# Altium footprint library Connector_Samtec_HLE_SMD.PcbLib: 290 footprints (part 11 of 24) (continued)
## Samtec_HLE-129-02-xxx-DV_2x29_P2.54mm_Horizontal [mm] (continued)
F.CrtYd:
  lines w0.05: -37.33,-4.17 37.33,-4.17 37.33,4.17 -37.33,4.17 -37.33,-4.17
F.Fab:
  lines w0.1: -36.06,2.54 -35.56,1.833 -35.06,2.54 ; -36.83,-2.54 36.83,-2.54 36.83,2.54 -36.83,2.54 -36.83,-2.54
  text "'.Designator'" at -4.047,-2.68 h1

## Samtec_HLE-130-02-xxx-DV-A_2x30_P2.54mm_Horizontal [mm]
pads (62):
  rect 1.27x2.29 smd: 1(-36.83,2.525) 2(-36.83,-2.525) 3(-34.29,2.525) 4(-34.29,-2.525) 5(-31.75,2.525) 6(-31.75,-2.525) 7(-29.21,2.525) 8(-29.21,-2.525) 9(-26.67,2.525) 10(-26.67,-2.525) 11(-24.13,2.525) 12(-24.13,-2.525) 13(-21.59,2.525) 14(-21.59,-2.525) 15(-19.05,2.525) 16(-19.05,-2.525) 17(-16.51,2.525) 18(-16.51,-2.525) 19(-13.97,2.525) 20(-13.97,-2.525) 21(-11.43,2.525) 22(-11.43,-2.525) 23(-8.89,2.525) 24(-8.89,-2.525) 25(-6.35,2.525) 26(-6.35,-2.525) 27(-3.81,2.525) 28(-3.81,-2.525) 29(-1.27,2.525) 30(-1.27,-2.525) 31(1.27,2.525) 32(1.27,-2.525) 33(3.81,2.525) 34(3.81,-2.525) 35(6.35,2.525) 36(6.35,-2.525) 37(8.89,2.525) 38(8.89,-2.525) 39(11.43,2.525) 40(11.43,-2.525) 41(13.97,2.525) 42(13.97,-2.525) 43(16.51,2.525) 44(16.51,-2.525) 45(19.05,2.525) 46(19.05,-2.525) 47(21.59,2.525) 48(21.59,-2.525) 49(24.13,2.525) 50(24.13,-2.525) 51(26.67,2.525) 52(26.67,-2.525) 53(29.21,2.525) 54(29.21,-2.525) 55(31.75,2.525) 56(31.75,-2.525) 57(34.29,2.525) 58(34.29,-2.525) 59(36.83,2.525) 60(36.83,-2.525)
  round 1.78 hole 1.78: Un1(-35.56,0) Un2(35.56,0)
F.SilkS:
  lines w0.12: -37.725,-2.65 -38.21,-2.65 -38.21,2.65 -37.725,2.65 -37.725,3.67 ; -35.935,-2.65 -35.185,-2.65 ; -35.935,2.65 -35.185,2.65 ; -33.395,-2.65 -32.645,-2.65 ; -33.395,2.65 -32.645,2.65 ; -30.855,-2.65 -30.105,-2.65 ; -30.855,2.65 -30.105,2.65 ; -28.315,-2.65 -27.565,-2.65 ; -28.315,2.65 -27.565,2.65 ; -25.775,-2.65 -25.025,-2.65 ; -25.775,2.65 -25.025,2.65 ; -23.235,-2.65 -22.485,-2.65 ; -23.235,2.65 -22.485,2.65 ; -20.695,-2.65 -19.945,-2.65 ; -20.695,2.65 -19.945,2.65 ; -18.155,-2.65 -17.405,-2.65 ; -18.155,2.65 -17.405,2.65 ; -15.615,-2.65 -14.865,-2.65 ; -15.615,2.65 -14.865,2.65 ; -13.075,-2.65 -12.325,-2.65 ; -13.075,2.65 -12.325,2.65 ; -10.535,-2.65 -9.785,-2.65 ; -10.535,2.65 -9.785,2.65 ; -7.995,-2.65 -7.245,-2.65 ; -7.995,2.65 -7.245,2.65 ; -5.455,-2.65 -4.705,-2.65 ; -5.455,2.65 -4.705,2.65 ; -2.915,-2.65 -2.165,-2.65 ; -2.915,2.65 -2.165,2.65 ; -0.375,-2.65 0.375,-2.65 ; -0.375,2.65 0.375,2.65 ; 2.165,-2.65 2.915,-2.65 ; 2.165,2.65 2.915,2.65 ; 4.705,-2.65 5.455,-2.65 ; 4.705,2.65 5.455,2.65 ; 7.245,-2.65 7.995,-2.65 ; 7.245,2.65 7.995,2.65 ; 9.785,-2.65 10.535,-2.65 ; 9.785,2.65 10.535,2.65 ; 12.325,-2.65 13.075,-2.65 ; 12.325,2.65 13.075,2.65 ; 14.865,-2.65 15.615,-2.65 ; 14.865,2.65 15.615,2.65 ; 17.405,-2.65 18.155,-2.65 ; 17.405,2.65 18.155,2.65 ; 19.945,-2.65 20.695,-2.65 ; 19.945,2.65 20.695,2.65 ; 22.485,-2.65 23.235,-2.65 ; 22.485,2.65 23.235,2.65 ; 25.025,-2.65 25.775,-2.65 ; 25.025,2.65 25.775,2.65 ; 27.565,-2.65 28.315,-2.65 ; 27.565,2.65 28.315,2.65 ; 30.105,-2.65 30.855,-2.65 ; 30.105,2.65 30.855,2.65 ; 32.645,-2.65 33.395,-2.65 ; 32.645,2.65 33.395,2.65 ; 35.185,-2.65 35.935,-2.65 ; 35.185,2.65 35.935,2.65 ; 37.725,-2.65 38.21,-2.65 38.21,2.65 37.725,2.65
F.CrtYd:
  lines w0.05: -38.6,-4.17 38.6,-4.17 38.6,4.17 -38.6,4.17 -38.6,-4.17
F.Fab:
  lines w0.1: -37.33,2.54 -36.83,1.833 -36.33,2.54 ; -38.1,-2.54 38.1,-2.54 38.1,2.54 -38.1,2.54 -38.1,-2.54
  text "'.Designator'" at -4.047,-2.68 h1

## Samtec_HLE-130-02-xxx-DV-BE-A_2x30_P2.54mm_Horizontal [mm]
pads (122):
  rect 1.27x1.68 smd: 1(-36.83,2.72) 2(-36.83,-2.72) 3(-34.29,2.72) 4(-34.29,-2.72) 5(-31.75,2.72) 6(-31.75,-2.72) 7(-29.21,2.72) 8(-29.21,-2.72) 9(-26.67,2.72) 10(-26.67,-2.72) 11(-24.13,2.72) 12(-24.13,-2.72) 13(-21.59,2.72) 14(-21.59,-2.72) 15(-19.05,2.72) 16(-19.05,-2.72) 17(-16.51,2.72) 18(-16.51,-2.72) 19(-13.97,2.72) 20(-13.97,-2.72) 21(-11.43,2.72) 22(-11.43,-2.72) 23(-8.89,2.72) 24(-8.89,-2.72) 25(-6.35,2.72) 26(-6.35,-2.72) 27(-3.81,2.72) 28(-3.81,-2.72) 29(-1.27,2.72) 30(-1.27,-2.72) 31(1.27,2.72) 32(1.27,-2.72) 33(3.81,2.72) 34(3.81,-2.72) 35(6.35,2.72) 36(6.35,-2.72) 37(8.89,2.72) 38(8.89,-2.72) 39(11.43,2.72) 40(11.43,-2.72) 41(13.97,2.72) 42(13.97,-2.72) 43(16.51,2.72) 44(16.51,-2.72) 45(19.05,2.72) 46(19.05,-2.72) 47(21.59,2.72) 48(21.59,-2.72) 49(24.13,2.72) 50(24.13,-2.72) 51(26.67,2.72) 52(26.67,-2.72) 53(29.21,2.72) 54(29.21,-2.72) 55(31.75,2.72) 56(31.75,-2.72) 57(34.29,2.72) 58(34.29,-2.72) 59(36.83,2.72) 60(36.83,-2.72)
  round 0.97 hole 0.97: Un1(-21.59,1.27) Un2(-1.27,-1.27) Un3(-36.83,-1.27) Un4(29.21,1.27) Un5(-24.13,-1.27) Un6(11.43,-1.27) Un7(36.83,-1.27) Un8(-11.43,-1.27) Un9(-16.51,-1.27) Un10(6.35,1.27) Un11(3.81,1.27) Un12(-16.51,1.27) Un13(-34.29,-1.27) Un14(21.59,1.27) Un15(1.27,-1.27) Un16(-8.89,-1.27) Un17(13.97,-1.27) Un18(-6.35,-1.27) Un19(-13.97,1.27) Un20(13.97,1.27) Un21(31.75,-1.27) Un22(26.67,-1.27) Un23(19.05,1.27) Un24(8.89,1.27) Un26(-3.81,1.27) Un27(-11.43,1.27) Un29(-13.97,-1.27) Un30(36.83,1.27) Un31(1.27,1.27) Un32(-31.75,1.27) Un33(-3.81,-1.27) Un34(29.21,-1.27) Un35(16.51,-1.27) Un36(24.13,1.27) Un37(-26.67,-1.27) Un38(3.81,-1.27) Un39(-29.21,-1.27) Un40(31.75,1.27) Un41(-19.05,-1.27) Un42(34.29,1.27) Un43(-26.67,1.27) Un44(-6.35,1.27) Un45(-34.29,1.27) Un46(-1.27,1.27) Un47(-24.13,1.27) Un48(26.67,1.27) Un49(16.51,1.27) Un50(-19.05,1.27) Un51(11.43,1.27) Un52(8.89,-1.27) Un53(-31.75,-1.27) Un54(24.13,-1.27) Un55(-29.21,1.27) Un56(34.29,-1.27) Un57(6.35,-1.27) Un58(-8.89,1.27) Un59(-21.59,-1.27) Un60(21.59,-1.27) Un61(19.05,-1.27) Un62(-36.83,1.27)
  round 1.78 hole 1.78: Un25(35.56,0) Un28(-35.56,0)
F.SilkS:
  lines w0.12: -37.725,-2.65 -38.21,-2.65 -38.21,2.65 -37.725,2.65 -37.725,3.56 ; -35.935,-2.65 -35.185,-2.65 ; -35.935,2.65 -35.185,2.65 ; -33.395,-2.65 -32.645,-2.65 ; -33.395,2.65 -32.645,2.65 ; -30.855,-2.65 -30.105,-2.65 ; -30.855,2.65 -30.105,2.65 ; -28.315,-2.65 -27.565,-2.65 ; -28.315,2.65 -27.565,2.65 ; -25.775,-2.65 -25.025,-2.65 ; -25.775,2.65 -25.025,2.65 ; -23.235,-2.65 -22.485,-2.65 ; -23.235,2.65 -22.485,2.65 ; -20.695,-2.65 -19.945,-2.65 ; -20.695,2.65 -19.945,2.65 ; -18.155,-2.65 -17.405,-2.65 ; -18.155,2.65 -17.405,2.65 ; -15.615,-2.65 -14.865,-2.65 ; -15.615,2.65 -14.865,2.65 ; -13.075,-2.65 -12.325,-2.65 ; -13.075,2.65 -12.325,2.65 ; -10.535,-2.65 -9.785,-2.65 ; -10.535,2.65 -9.785,2.65 ; -7.995,-2.65 -7.245,-2.65 ; -7.995,2.65 -7.245,2.65 ; -5.455,-2.65 -4.705,-2.65 ; -5.455,2.65 -4.705,2.65 ; -2.915,-2.65 -2.165,-2.65 ; -2.915,2.65 -2.165,2.65 ; -0.375,-2.65 0.375,-2.65 ; -0.375,2.65 0.375,2.65 ; 2.165,-2.65 2.915,-2.65 ; 2.165,2.65 2.915,2.65 ; 4.705,-2.65 5.455,-2.65 ; 4.705,2.65 5.455,2.65 ; 7.245,-2.65 7.995,-2.65 ; 7.245,2.65 7.995,2.65 ; 9.785,-2.65 10.535,-2.65 ; 9.785,2.65 10.535,2.65 ; 12.325,-2.65 13.075,-2.65 ; 12.325,2.65 13.075,2.65 ; 14.865,-2.65 15.615,-2.65 ; 14.865,2.65 15.615,2.65 ; 17.405,-2.65 18.155,-2.65 ; 17.405,2.65 18.155,2.65 ; 19.945,-2.65 20.695,-2.65 ; 19.945,2.65 20.695,2.65 ; 22.485,-2.65 23.235,-2.65 ; 22.485,2.65 23.235,2.65 ; 25.025,-2.65 25.775,-2.65 ; 25.025,2.65 25.775,2.65 ; 27.565,-2.65 28.315,-2.65 ; 27.565,2.65 28.315,2.65 ; 30.105,-2.65 30.855,-2.65 ; 30.105,2.65 30.855,2.65 ; 32.645,-2.65 33.395,-2.65 ; 32.645,2.65 33.395,2.65 ; 35.185,-2.65 35.935,-2.65 ; 35.185,2.65 35.935,2.65 ; 37.725,-2.65 38.21,-2.65 38.21,2.65 37.725,2.65
F.CrtYd:
  lines w0.05: -38.6,-4.06 38.6,-4.06 38.6,4.06 -38.6,4.06 -38.6,-4.06
F.Fab:
  lines w0.1: -37.33,2.54 -36.83,1.833 -36.33,2.54 ; -38.1,-2.54 38.1,-2.54 38.1,2.54 -38.1,2.54 -38.1,-2.54
  text "'.Designator'" at -4.047,-2.68 h1

## Samtec_HLE-130-02-xxx-DV-BE-LC_2x30_P2.54mm_Horizontal [mm]
pads (122):
  rect 1.27x1.68 smd: 1(-36.83,2.72) 2(-36.83,-2.72) 3(-34.29,2.72) 4(-34.29,-2.72) 5(-31.75,2.72) 6(-31.75,-2.72) 7(-29.21,2.72) 8(-29.21,-2.72) 9(-26.67,2.72) 10(-26.67,-2.72) 11(-24.13,2.72) 12(-24.13,-2.72) 13(-21.59,2.72) 14(-21.59,-2.72) 15(-19.05,2.72) 16(-19.05,-2.72) 17(-16.51,2.72) 18(-16.51,-2.72) 19(-13.97,2.72) 20(-13.97,-2.72) 21(-11.43,2.72) 22(-11.43,-2.72) 23(-8.89,2.72) 24(-8.89,-2.72) 25(-6.35,2.72) 26(-6.35,-2.72) 27(-3.81,2.72) 28(-3.81,-2.72) 29(-1.27,2.72) 30(-1.27,-2.72) 31(1.27,2.72) 32(1.27,-2.72) 33(3.81,2.72) 34(3.81,-2.72) 35(6.35,2.72) 36(6.35,-2.72) 37(8.89,2.72) 38(8.89,-2.72) 39(11.43,2.72) 40(11.43,-2.72) 41(13.97,2.72) 42(13.97,-2.72) 43(16.51,2.72) 44(16.51,-2.72) 45(19.05,2.72) 46(19.05,-2.72) 47(21.59,2.72) 48(21.59,-2.72) 49(24.13,2.72) 50(24.13,-2.72) 51(26.67,2.72) 52(26.67,-2.72) 53(29.21,2.72) 54(29.21,-2.72) 55(31.75,2.72) 56(31.75,-2.72) 57(34.29,2.72) 58(34.29,-2.72) 59(36.83,2.72) 60(36.83,-2.72)
  round 0.97 hole 0.97: Un1(-6.35,1.27) Un3(16.51,-1.27) Un4(-21.59,1.27) Un5(34.29,-1.27) Un6(6.35,1.27) Un7(-13.97,-1.27) Un8(24.13,-1.27) Un9(6.35,-1.27) Un10(-34.29,-1.27) Un11(36.83,-1.27) Un12(-11.43,1.27) Un13(-26.67,-1.27) Un14(-1.27,-1.27) Un15(21.59,1.27) Un16(24.13,1.27) Un17(11.43,-1.27) Un18(-6.35,-1.27) Un19(29.21,-1.27) Un20(-19.05,1.27) Un21(-34.29,1.27) Un22(26.67,-1.27) Un23(26.67,1.27) Un24(-36.83,-1.27) Un25(31.75,1.27) Un26(-31.75,-1.27) Un27(-11.43,-1.27) Un28(-3.81,1.27) Un29(-1.27,1.27) Un30(-19.05,-1.27) Un31(-16.51,-1.27) Un32(21.59,-1.27) Un34(1.27,-1.27) Un35(-31.75,1.27) Un36(-24.13,1.27) Un37(-16.51,1.27) Un38(3.81,-1.27) Un39(13.97,1.27) Un40(-8.89,-1.27) Un41(11.43,1.27) Un42(16.51,1.27) Un43(-26.67,1.27) Un44(-8.89,1.27) Un45(-36.83,1.27) Un46(8.89,1.27) Un47(3.81,1.27) Un48(31.75,-1.27) Un49(36.83,1.27) Un50(-3.81,-1.27) Un51(19.05,1.27) Un52(-29.21,-1.27) Un53(19.05,-1.27) Un54(29.21,1.27) Un55(-21.59,-1.27) Un56(13.97,-1.27) Un57(-29.21,1.27) Un58(-13.97,1.27) Un59(34.29,1.27) Un60(8.89,-1.27) Un61(1.27,1.27) Un62(-24.13,-1.27)
  round 1.19 hole 1.19: Un2(-35.56,0) Un33(35.56,0)
F.SilkS:
  lines w0.12: -37.725,-2.65 -38.21,-2.65 -38.21,2.65 -37.725,2.65 -37.725,3.56 ; -35.935,-2.65 -35.185,-2.65 ; -35.935,2.65 -35.185,2.65 ; -33.395,-2.65 -32.645,-2.65 ; -33.395,2.65 -32.645,2.65 ; -30.855,-2.65 -30.105,-2.65 ; -30.855,2.65 -30.105,2.65 ; -28.315,-2.65 -27.565,-2.65 ; -28.315,2.65 -27.565,2.65 ; -25.775,-2.65 -25.025,-2.65 ; -25.775,2.65 -25.025,2.65 ; -23.235,-2.65 -22.485,-2.65 ; -23.235,2.65 -22.485,2.65 ; -20.695,-2.65 -19.945,-2.65 ; -20.695,2.65 -19.945,2.65 ; -18.155,-2.65 -17.405,-2.65 ; -18.155,2.65 -17.405,2.65 ; -15.615,-2.65 -14.865,-2.65 ; -15.615,2.65 -14.865,2.65 ; -13.075,-2.65 -12.325,-2.65 ; -13.075,2.65 -12.325,2.65 ; -10.535,-2.65 -9.785,-2.65 ; -10.535,2.65 -9.785,2.65 ; -7.995,-2.65 -7.245,-2.65 ; -7.995,2.65 -7.245,2.65 ; -5.455,-2.65 -4.705,-2.65 ; -5.455,2.65 -4.705,2.65 ; -2.915,-2.65 -2.165,-2.65 ; -2.915,2.65 -2.165,2.65 ; -0.375,-2.65 0.375,-2.65 ; -0.375,2.65 0.375,2.65 ; 2.165,-2.65 2.915,-2.65 ; 2.165,2.65 2.915,2.65 ; 4.705,-2.65 5.455,-2.65 ; 4.705,2.65 5.455,2.65 ; 7.245,-2.65 7.995,-2.65 ; 7.245,2.65 7.995,2.65 ; 9.785,-2.65 10.535,-2.65 ; 9.785,2.65 10.535,2.65 ; 12.325,-2.65 13.075,-2.65 ; 12.325,2.65 13.075,2.65 ; 14.865,-2.65 15.615,-2.65 ; 14.865,2.65 15.615,2.65 ; 17.405,-2.65 18.155,-2.65 ; 17.405,2.65 18.155,2.65 ; 19.945,-2.65 20.695,-2.65 ; 19.945,2.65 20.695,2.65 ; 22.485,-2.65 23.235,-2.65 ; 22.485,2.65 23.235,2.65 ; 25.025,-2.65 25.775,-2.65 ; 25.025,2.65 25.775,2.65 ; 27.565,-2.65 28.315,-2.65 ; 27.565,2.65 28.315,2.65 ; 30.105,-2.65 30.855,-2.65 ; 30.105,2.65 30.855,2.65 ; 32.645,-2.65 33.395,-2.65 ; 32.645,2.65 33.395,2.65 ; 35.185,-2.65 35.935,-2.65 ; 35.185,2.65 35.935,2.65 ; 37.725,-2.65 38.21,-2.65 38.21,2.65 37.725,2.65
F.CrtYd:
  lines w0.05: -38.6,-4.06 38.6,-4.06 38.6,4.06 -38.6,4.06 -38.6,-4.06
F.Fab:
  lines w0.1: -37.33,2.54 -36.83,1.833 -36.33,2.54 ; -38.1,-2.54 38.1,-2.54 38.1,2.54 -38.1,2.54 -38.1,-2.54
  text "'.Designator'" at -4.047,-2.68 h1

## Samtec_HLE-130-02-xxx-DV-BE_2x30_P2.54mm_Horizontal [mm]
pads (120):
  rect 1.27x1.68 smd: 1(-36.83,2.72) 2(-36.83,-2.72) 3(-34.29,2.72) 4(-34.29,-2.72) 5(-31.75,2.72) 6(-31.75,-2.72) 7(-29.21,2.72) 8(-29.21,-2.72) 9(-26.67,2.72) 10(-26.67,-2.72) 11(-24.13,2.72) 12(-24.13,-2.72) 13(-21.59,2.72) 14(-21.59,-2.72) 15(-19.05,2.72) 16(-19.05,-2.72) 17(-16.51,2.72) 18(-16.51,-2.72) 19(-13.97,2.72) 20(-13.97,-2.72) 21(-11.43,2.72) 22(-11.43,-2.72) 23(-8.89,2.72) 24(-8.89,-2.72) 25(-6.35,2.72) 26(-6.35,-2.72) 27(-3.81,2.72) 28(-3.81,-2.72) 29(-1.27,2.72) 30(-1.27,-2.72) 31(1.27,2.72) 32(1.27,-2.72) 33(3.81,2.72) 34(3.81,-2.72) 35(6.35,2.72) 36(6.35,-2.72) 37(8.89,2.72) 38(8.89,-2.72) 39(11.43,2.72) 40(11.43,-2.72) 41(13.97,2.72) 42(13.97,-2.72) 43(16.51,2.72) 44(16.51,-2.72) 45(19.05,2.72) 46(19.05,-2.72) 47(21.59,2.72) 48(21.59,-2.72) 49(24.13,2.72) 50(24.13,-2.72) 51(26.67,2.72) 52(26.67,-2.72) 53(29.21,2.72) 54(29.21,-2.72) 55(31.75,2.72) 56(31.75,-2.72) 57(34.29,2.72) 58(34.29,-2.72) 59(36.83,2.72) 60(36.83,-2.72)
  round 0.97 hole 0.97: Un1(36.83,-1.27) Un2(-6.35,1.27) Un3(19.05,-1.27) Un4(16.51,1.27) Un5(31.75,-1.27) Un6(29.21,-1.27) Un7(6.35,1.27) Un8(-29.21,1.27) Un9(19.05,1.27) Un10(-21.59,1.27) Un11(1.27,1.27) Un12(26.67,1.27) Un13(-34.29,1.27) Un14(-13.97,-1.27) Un15(1.27,-1.27) Un16(6.35,-1.27) Un17(-24.13,1.27) Un18(26.67,-1.27) Un19(-1.27,1.27) Un20(-36.83,-1.27) Un21(-11.43,-1.27) Un22(-36.83,1.27) Un23(34.29,1.27) Un24(13.97,1.27) Un25(-29.21,-1.27) Un26(-19.05,-1.27) Un27(-31.75,1.27) Un28(11.43,-1.27) Un29(31.75,1.27) Un30(-16.51,1.27) Un31(-13.97,1.27) Un32(-26.67,1.27) Un33(-8.89,-1.27) Un34(-3.81,1.27) Un35(13.97,-1.27) Un36(-8.89,1.27) Un37(21.59,1.27) Un38(-34.29,-1.27) Un39(11.43,1.27) Un40(8.89,-1.27) Un41(-26.67,-1.27) Un42(34.29,-1.27) Un43(36.83,1.27) Un44(8.89,1.27) Un45(24.13,-1.27) Un46(-24.13,-1.27) Un47(-16.51,-1.27) Un48(-31.75,-1.27) Un49(3.81,1.27) Un50(-3.81,-1.27) Un51(24.13,1.27) Un52(-6.35,-1.27) Un53(16.51,-1.27) Un54(-1.27,-1.27) Un55(-19.05,1.27) Un56(3.81,-1.27) Un57(29.21,1.27) Un58(-21.59,-1.27) Un59(-11.43,1.27) Un60(21.59,-1.27)
F.SilkS:
  lines w0.12: -37.725,-2.65 -38.21,-2.65 -38.21,2.65 -37.725,2.65 -37.725,3.56 ; -35.935,-2.65 -35.185,-2.65 ; -35.935,2.65 -35.185,2.65 ; -33.395,-2.65 -32.645,-2.65 ; -33.395,2.65 -32.645,2.65 ; -30.855,-2.65 -30.105,-2.65 ; -30.855,2.65 -30.105,2.65 ; -28.315,-2.65 -27.565,-2.65 ; -28.315,2.65 -27.565,2.65 ; -25.775,-2.65 -25.025,-2.65 ; -25.775,2.65 -25.025,2.65 ; -23.235,-2.65 -22.485,-2.65 ; -23.235,2.65 -22.485,2.65 ; -20.695,-2.65 -19.945,-2.65 ; -20.695,2.65 -19.945,2.65 ; -18.155,-2.65 -17.405,-2.65 ; -18.155,2.65 -17.405,2.65 ; -15.615,-2.65 -14.865,-2.65 ; -15.615,2.65 -14.865,2.65 ; -13.075,-2.65 -12.325,-2.65 ; -13.075,2.65 -12.325,2.65 ; -10.535,-2.65 -9.785,-2.65 ; -10.535,2.65 -9.785,2.65 ; -7.995,-2.65 -7.245,-2.65 ; -7.995,2.65 -7.245,2.65 ; -5.455,-2.65 -4.705,-2.65 ; -5.455,2.65 -4.705,2.65 ; -2.915,-2.65 -2.165,-2.65 ; -2.915,2.65 -2.165,2.65 ; -0.375,-2.65 0.375,-2.65 ; -0.375,2.65 0.375,2.65 ; 2.165,-2.65 2.915,-2.65 ; 2.165,2.65 2.915,2.65 ; 4.705,-2.65 5.455,-2.65 ; 4.705,2.65 5.455,2.65 ; 7.245,-2.65 7.995,-2.65 ; 7.245,2.65 7.995,2.65 ; 9.785,-2.65 10.535,-2.65 ; 9.785,2.65 10.535,2.65 ; 12.325,-2.65 13.075,-2.65 ; 12.325,2.65 13.075,2.65 ; 14.865,-2.65 15.615,-2.65 ; 14.865,2.65 15.615,2.65 ; 17.405,-2.65 18.155,-2.65 ; 17.405,2.65 18.155,2.65 ; 19.945,-2.65 20.695,-2.65 ; 19.945,2.65 20.695,2.65 ; 22.485,-2.65 23.235,-2.65 ; 22.485,2.65 23.235,2.65 ; 25.025,-2.65 25.775,-2.65 ; 25.025,2.65 25.775,2.65 ; 27.565,-2.65 28.315,-2.65 ; 27.565,2.65 28.315,2.65 ; 30.105,-2.65 30.855,-2.65 ; 30.105,2.65 30.855,2.65 ; 32.645,-2.65 33.395,-2.65 ; 32.645,2.65 33.395,2.65 ; 35.185,-2.65 35.935,-2.65 ; 35.185,2.65 35.935,2.65 ; 37.725,-2.65 38.21,-2.65 38.21,2.65 37.725,2.65
F.CrtYd:
  lines w0.05: -38.6,-4.06 38.6,-4.06 38.6,4.06 -38.6,4.06 -38.6,-4.06
F.Fab:
  lines w0.1: -37.33,2.54 -36.83,1.833 -36.33,2.54 ; -38.1,-2.54 -38.1,2.54 38.1,2.54 38.1,-2.54 -38.1,-2.54
  text "'.Designator'" at -4.047,-2.68 h1

## Samtec_HLE-130-02-xxx-DV-LC_2x30_P2.54mm_Horizontal [mm]
pads (62):
  rect 1.27x2.29 smd: 1(-36.83,2.525) 2(-36.83,-2.525) 3(-34.29,2.525) 4(-34.29,-2.525) 5(-31.75,2.525) 6(-31.75,-2.525) 7(-29.21,2.525) 8(-29.21,-2.525) 9(-26.67,2.525) 10(-26.67,-2.525) 11(-24.13,2.525) 12(-24.13,-2.525) 13(-21.59,2.525) 14(-21.59,-2.525) 15(-19.05,2.525) 16(-19.05,-2.525) 17(-16.51,2.525) 18(-16.51,-2.525) 19(-13.97,2.525) 20(-13.97,-2.525) 21(-11.43,2.525) 22(-11.43,-2.525) 23(-8.89,2.525) 24(-8.89,-2.525) 25(-6.35,2.525) 26(-6.35,-2.525) 27(-3.81,2.525) 28(-3.81,-2.525) 29(-1.27,2.525) 30(-1.27,-2.525) 31(1.27,2.525) 32(1.27,-2.525) 33(3.81,2.525) 34(3.81,-2.525) 35(6.35,2.525) 36(6.35,-2.525) 37(8.89,2.525) 38(8.89,-2.525) 39(11.43,2.525) 40(11.43,-2.525) 41(13.97,2.525) 42(13.97,-2.525) 43(16.51,2.525) 44(16.51,-2.525) 45(19.05,2.525) 46(19.05,-2.525) 47(21.59,2.525) 48(21.59,-2.525) 49(24.13,2.525) 50(24.13,-2.525) 51(26.67,2.525) 52(26.67,-2.525) 53(29.21,2.525) 54(29.21,-2.525) 55(31.75,2.525) 56(31.75,-2.525) 57(34.29,2.525) 58(34.29,-2.525) 59(36.83,2.525) 60(36.83,-2.525)
  round 1.19 hole 1.19: Un1(-35.56,0) Un2(35.56,0)
F.SilkS:
  lines w0.12: -37.725,-2.65 -38.21,-2.65 -38.21,2.65 -37.725,2.65 -37.725,3.67 ; -35.935,-2.65 -35.185,-2.65 ; -35.935,2.65 -35.185,2.65 ; -33.395,-2.65 -32.645,-2.65 ; -33.395,2.65 -32.645,2.65 ; -30.855,-2.65 -30.105,-2.65 ; -30.855,2.65 -30.105,2.65 ; -28.315,-2.65 -27.565,-2.65 ; -28.315,2.65 -27.565,2.65 ; -25.775,-2.65 -25.025,-2.65 ; -25.775,2.65 -25.025,2.65 ; -23.235,-2.65 -22.485,-2.65 ; -23.235,2.65 -22.485,2.65 ; -20.695,-2.65 -19.945,-2.65 ; -20.695,2.65 -19.945,2.65 ; -18.155,-2.65 -17.405,-2.65 ; -18.155,2.65 -17.405,2.65 ; -15.615,-2.65 -14.865,-2.65 ; -15.615,2.65 -14.865,2.65 ; -13.075,-2.65 -12.325,-2.65 ; -13.075,2.65 -12.325,2.65 ; -10.535,-2.65 -9.785,-2.65 ; -10.535,2.65 -9.785,2.65 ; -7.995,-2.65 -7.245,-2.65 ; -7.995,2.65 -7.245,2.65 ; -5.455,-2.65 -4.705,-2.65 ; -5.455,2.65 -4.705,2.65 ; -2.915,-2.65 -2.165,-2.65 ; -2.915,2.65 -2.165,2.65 ; -0.375,-2.65 0.375,-2.65 ; -0.375,2.65 0.375,2.65 ; 2.165,-2.65 2.915,-2.65 ; 2.165,2.65 2.915,2.65 ; 4.705,-2.65 5.455,-2.65 ; 4.705,2.65 5.455,2.65 ; 7.245,-2.65 7.995,-2.65 ; 7.245,2.65 7.995,2.65 ; 9.785,-2.65 10.535,-2.65 ; 9.785,2.65 10.535,2.65 ; 12.325,-2.65 13.075,-2.65 ; 12.325,2.65 13.075,2.65 ; 14.865,-2.65 15.615,-2.65 ; 14.865,2.65 15.615,2.65 ; 17.405,-2.65 18.155,-2.65 ; 17.405,2.65 18.155,2.65 ; 19.945,-2.65 20.695,-2.65 ; 19.945,2.65 20.695,2.65 ; 22.485,-2.65 23.235,-2.65 ; 22.485,2.65 23.235,2.65 ; 25.025,-2.65 25.775,-2.65 ; 25.025,2.65 25.775,2.65 ; 27.565,-2.65 28.315,-2.65 ; 27.565,2.65 28.315,2.65 ; 30.105,-2.65 30.855,-2.65 ; 30.105,2.65 30.855,2.65 ; 32.645,-2.65 33.395,-2.65 ; 32.645,2.65 33.395,2.65 ; 35.185,-2.65 35.935,-2.65 ; 35.185,2.65 35.935,2.65 ; 37.725,-2.65 38.21,-2.65 38.21,2.65 37.725,2.65
F.CrtYd:
  lines w0.05: -38.6,-4.17 38.6,-4.17 38.6,4.17 -38.6,4.17 -38.6,-4.17
F.Fab:
  lines w0.1: -37.33,2.54 -36.83,1.833 -36.33,2.54 ; -38.1,-2.54 -38.1,2.54 38.1,2.54 38.1,-2.54 -38.1,-2.54
  text "'.Designator'" at -4.047,-2.68 h1

## Samtec_HLE-130-02-xxx-DV_2x30_P2.54mm_Horizontal [mm]
pads (60):
  rect 1.27x2.29 smd: 1(-36.83,2.525) 2(-36.83,-2.525) 3(-34.29,2.525) 4(-34.29,-2.525) 5(-31.75,2.525) 6(-31.75,-2.525) 7(-29.21,2.525) 8(-29.21,-2.525) 9(-26.67,2.525) 10(-26.67,-2.525) 11(-24.13,2.525) 12(-24.13,-2.525) 13(-21.59,2.525) 14(-21.59,-2.525) 15(-19.05,2.525) 16(-19.05,-2.525) 17(-16.51,2.525) 18(-16.51,-2.525) 19(-13.97,2.525) 20(-13.97,-2.525) 21(-11.43,2.525) 22(-11.43,-2.525) 23(-8.89,2.525) 24(-8.89,-2.525) 25(-6.35,2.525) 26(-6.35,-2.525) 27(-3.81,2.525) 28(-3.81,-2.525) 29(-1.27,2.525) 30(-1.27,-2.525) 31(1.27,2.525) 32(1.27,-2.525) 33(3.81,2.525) 34(3.81,-2.525) 35(6.35,2.525) 36(6.35,-2.525) 37(8.89,2.525) 38(8.89,-2.525) 39(11.43,2.525) 40(11.43,-2.525) 41(13.97,2.525) 42(13.97,-2.525) 43(16.51,2.525) 44(16.51,-2.525) 45(19.05,2.525) 46(19.05,-2.525) 47(21.59,2.525) 48(21.59,-2.525) 49(24.13,2.525) 50(24.13,-2.525) 51(26.67,2.525) 52(26.67,-2.525) 53(29.21,2.525) 54(29.21,-2.525) 55(31.75,2.525) 56(31.75,-2.525) 57(34.29,2.525) 58(34.29,-2.525) 59(36.83,2.525) 60(36.83,-2.525)
F.SilkS:
  lines w0.12: -37.725,-2.65 -38.21,-2.65 -38.21,2.65 -37.725,2.65 -37.725,3.67 ; -35.935,-2.65 -35.185,-2.65 ; -35.935,2.65 -35.185,2.65 ; -33.395,-2.65 -32.645,-2.65 ; -33.395,2.65 -32.645,2.65 ; -30.855,-2.65 -30.105,-2.65 ; -30.855,2.65 -30.105,2.65 ; -28.315,-2.65 -27.565,-2.65 ; -28.315,2.65 -27.565,2.65 ; -25.775,-2.65 -25.025,-2.65 ; -25.775,2.65 -25.025,2.65 ; -23.235,-2.65 -22.485,-2.65 ; -23.235,2.65 -22.485,2.65 ; -20.695,-2.65 -19.945,-2.65 ; -20.695,2.65 -19.945,2.65 ; -18.155,-2.65 -17.405,-2.65 ; -18.155,2.65 -17.405,2.65 ; -15.615,-2.65 -14.865,-2.65 ; -15.615,2.65 -14.865,2.65 ; -13.075,-2.65 -12.325,-2.65 ; -13.075,2.65 -12.325,2.65 ; -10.535,-2.65 -9.785,-2.65 ; -10.535,2.65 -9.785,2.65 ; -7.995,-2.65 -7.245,-2.65 ; -7.995,2.65 -7.245,2.65 ; -5.455,-2.65 -4.705,-2.65 ; -5.455,2.65 -4.705,2.65 ; -2.915,-2.65 -2.165,-2.65 ; -2.915,2.65 -2.165,2.65 ; -0.375,-2.65 0.375,-2.65 ; -0.375,2.65 0.375,2.65 ; 2.165,-2.65 2.915,-2.65 ; 2.165,2.65 2.915,2.65 ; 4.705,-2.65 5.455,-2.65 ; 4.705,2.65 5.455,2.65 ; 7.245,-2.65 7.995,-2.65 ; 7.245,2.65 7.995,2.65 ; 9.785,-2.65 10.535,-2.65 ; 9.785,2.65 10.535,2.65 ; 12.325,-2.65 13.075,-2.65 ; 12.325,2.65 13.075,2.65 ; 14.865,-2.65 15.615,-2.65 ; 14.865,2.65 15.615,2.65 ; 17.405,-2.65 18.155,-2.65 ; 17.405,2.65 18.155,2.65 ; 19.945,-2.65 20.695,-2.65 ; 19.945,2.65 20.695,2.65 ; 22.485,-2.65 23.235,-2.65 ; 22.485,2.65 23.235,2.65 ; 25.025,-2.65 25.775,-2.65 ; 25.025,2.65 25.775,2.65 ; 27.565,-2.65 28.315,-2.65 ; 27.565,2.65 28.315,2.65 ; 30.105,-2.65 30.855,-2.65 ; 30.105,2.65 30.855,2.65 ; 32.645,-2.65 33.395,-2.65 ; 32.645,2.65 33.395,2.65 ; 35.185,-2.65 35.935,-2.65 ; 35.185,2.65 35.935,2.65 ; 37.725,-2.65 38.21,-2.65 38.21,2.65 37.725,2.65
F.CrtYd:
  lines w0.05: -38.6,-4.17 -38.6,4.17 38.6,4.17 38.6,-4.17 -38.6,-4.17
F.Fab:
  lines w0.1: -37.33,2.54 -36.83,1.833 -36.33,2.54 ; -38.1,-2.54 -38.1,2.54 38.1,2.54 38.1,-2.54 -38.1,-2.54
  text "'.Designator'" at -4.047,-2.68 h1

## Samtec_HLE-131-02-xxx-DV-A_2x31_P2.54mm_Horizontal [mm]
pads (64):
  rect 1.27x2.29 smd: 1(-38.1,2.525) 2(-38.1,-2.525) 3(-35.56,2.525) 4(-35.56,-2.525) 5(-33.02,2.525) 6(-33.02,-2.525) 7(-30.48,2.525) 8(-30.48,-2.525) 9(-27.94,2.525) 10(-27.94,-2.525) 11(-25.4,2.525) 12(-25.4,-2.525) 13(-22.86,2.525) 14(-22.86,-2.525) 15(-20.32,2.525) 16(-20.32,-2.525) 17(-17.78,2.525) 18(-17.78,-2.525) 19(-15.24,2.525) 20(-15.24,-2.525) 21(-12.7,2.525) 22(-12.7,-2.525) 23(-10.16,2.525) 24(-10.16,-2.525) 25(-7.62,2.525) 26(-7.62,-2.525) 27(-5.08,2.525) 28(-5.08,-2.525) 29(-2.54,2.525) 30(-2.54,-2.525) 31(0,2.525) 32(0,-2.525) 33(2.54,2.525) 34(2.54,-2.525) 35(5.08,2.525) 36(5.08,-2.525) 37(7.62,2.525) 38(7.62,-2.525) 39(10.16,2.525) 40(10.16,-2.525) 41(12.7,2.525) 42(12.7,-2.525) 43(15.24,2.525) 44(15.24,-2.525) 45(17.78,2.525) 46(17.78,-2.525) 47(20.32,2.525) 48(20.32,-2.525) 49(22.86,2.525) 50(22.86,-2.525) 51(25.4,2.525) 52(25.4,-2.525) 53(27.94,2.525) 54(27.94,-2.525) 55(30.48,2.525) 56(30.48,-2.525) 57(33.02,2.525) 58(33.02,-2.525) 59(35.56,2.525) 60(35.56,-2.525) 61(38.1,2.525) 62(38.1,-2.525)
  round 1.78 hole 1.78: Un1(36.83,0) Un2(-36.83,0)
F.SilkS:
  lines w0.12: -38.995,-2.65 -39.48,-2.65 -39.48,2.65 -38.995,2.65 -38.995,3.67 ; -37.205,-2.65 -36.455,-2.65 ; -37.205,2.65 -36.455,2.65 ; -34.665,-2.65 -33.915,-2.65 ; -34.665,2.65 -33.915,2.65 ; -32.125,-2.65 -31.375,-2.65 ; -32.125,2.65 -31.375,2.65 ; -29.585,-2.65 -28.835,-2.65 ; -29.585,2.65 -28.835,2.65 ; -27.045,-2.65 -26.295,-2.65 ; -27.045,2.65 -26.295,2.65 ; -24.505,-2.65 -23.755,-2.65 ; -24.505,2.65 -23.755,2.65 ; -21.965,-2.65 -21.215,-2.65 ; -21.965,2.65 -21.215,2.65 ; -19.425,-2.65 -18.675,-2.65 ; -19.425,2.65 -18.675,2.65 ; -16.885,-2.65 -16.135,-2.65 ; -16.885,2.65 -16.135,2.65 ; -14.345,-2.65 -13.595,-2.65 ; -14.345,2.65 -13.595,2.65 ; -11.805,-2.65 -11.055,-2.65 ; -11.805,2.65 -11.055,2.65 ; -9.265,-2.65 -8.515,-2.65 ; -9.265,2.65 -8.515,2.65 ; -6.725,-2.65 -5.975,-2.65 ; -6.725,2.65 -5.975,2.65 ; -4.185,-2.65 -3.435,-2.65 ; -4.185,2.65 -3.435,2.65 ; -1.645,-2.65 -0.895,-2.65 ; -1.645,2.65 -0.895,2.65 ; 0.895,-2.65 1.645,-2.65 ; 0.895,2.65 1.645,2.65 ; 3.435,-2.65 4.185,-2.65 ; 3.435,2.65 4.185,2.65 ; 5.975,-2.65 6.725,-2.65 ; 5.975,2.65 6.725,2.65 ; 8.515,-2.65 9.265,-2.65 ; 8.515,2.65 9.265,2.65 ; 11.055,-2.65 11.805,-2.65 ; 11.055,2.65 11.805,2.65 ; 13.595,-2.65 14.345,-2.65 ; 13.595,2.65 14.345,2.65 ; 16.135,-2.65 16.885,-2.65 ; 16.135,2.65 16.885,2.65 ; 18.675,-2.65 19.425,-2.65 ; 18.675,2.65 19.425,2.65 ; 21.215,-2.65 21.965,-2.65 ; 21.215,2.65 21.965,2.65 ; 23.755,-2.65 24.505,-2.65 ; 23.755,2.65 24.505,2.65 ; 26.295,-2.65 27.045,-2.65 ; 26.295,2.65 27.045,2.65 ; 28.835,-2.65 29.585,-2.65 ; 28.835,2.65 29.585,2.65 ; 31.375,-2.65 32.125,-2.65 ; 31.375,2.65 32.125,2.65 ; 33.915,-2.65 34.665,-2.65 ; 33.915,2.65 34.665,2.65 ; 36.455,-2.65 37.205,-2.65 ; 36.455,2.65 37.205,2.65 ; 38.995,-2.65 39.48,-2.65 39.48,2.65 38.995,2.65
F.CrtYd:
  lines w0.05: -39.87,-4.17 39.87,-4.17 39.87,4.17 -39.87,4.17 -39.87,-4.17
F.Fab:
  lines w0.1: -38.6,2.54 -38.1,1.833 -37.6,2.54 ; -39.37,-2.54 -39.37,2.54 39.37,2.54 39.37,-2.54 -39.37,-2.54
  text "'.Designator'" at -4.047,-2.68 h1